# Altium footprint library PcbLib_jp.PcbLib: 255 footprints (part 7 of 16)
Each footprint in its own frame and in the unit in brackets; x right, y up, seen from the top. Pads: shape width x height; smd on the part's side, far side on the other; paste and mask are expansions set on the pad; w line width, h text height; cw(c..) or ccw(c..) is an arc to the next point about the centre after c.
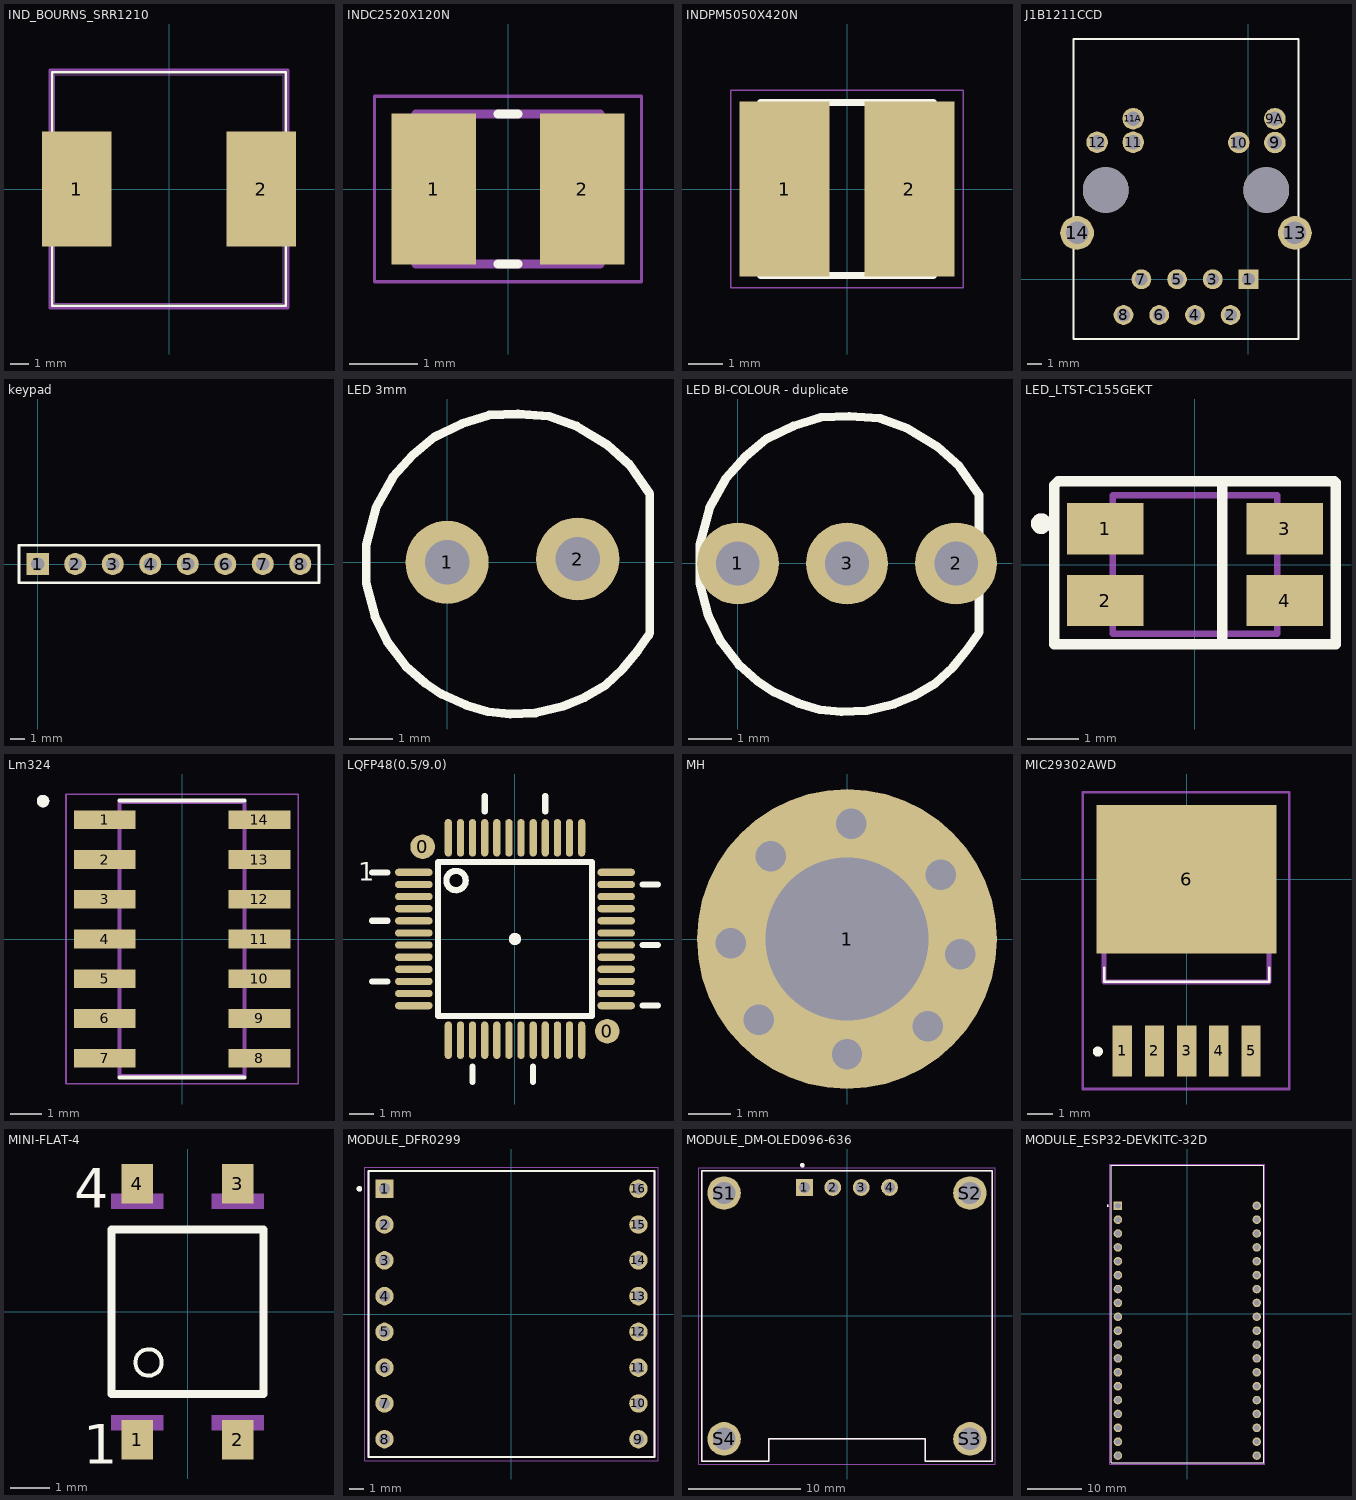
[diagram p6: the footprints below, top view; thin cyan lines are the x and y axes]

## IND_BOURNS_SRR1210 [mil]
pads (2):
  rect 149.37x248.39 smd paste+0 mask+0: 1(-198.5,0) 2(198.5,0)
Top Overlay:
  lines w6: -251,-117.6 -251,-251 251,-251 251,-117.6 ; -251,117.6 -251,251 251,251 251,117.6
Mechanical 13:
  lines w1: -246,-246 -246,246 246,246 246,-246 -246,-246
Mechanical 15:
  lines w6: -263.5,-114.5 -256,-114.5 -256,-256 256,-256 256,-114.5 263.5,-114.5 263.5,114.5 256,114.5 256,256 -256,256 -256,114.5 -263.5,114.5 -263.5,-114.5
3D body "IND_BOURNS_SRR1210.step": height 394.02, standoff 0, extent -248.74,-241.38 243.23,250.83

## INDC2520X120N [mm]
pads (2):
  rect 1.24x2.22 smd: 1(-1.09,0) 2(1.09,0)
Top Overlay:
  lines w0.127: -0.15,-1.1 0.15,-1.1 ; -0.15,1.1 0.15,1.1
Mechanical 13:
  lines w0.127: -1.35,-1.1 -1.35,1.1 1.35,1.1 1.35,-1.1 -1.35,-1.1
Mechanical 15:
  lines w0.05: -1.958,-1.358 -1.958,1.358 1.958,1.358 1.958,-1.358 -1.958,-1.358
3D body "DFE252012F-100M_P2.step": height 1.2, standoff 0, extent -1.17,-1.04 1.33,0.96

## INDPM5050X420N [mm]
pads (2):
  rect 2.6x5.05 smd: 1(-1.8,0) 2(1.8,0)
Top Overlay:
  lines w0.2: -2.5,-2.5 2.5,-2.5 ; -2.5,2.5 2.5,2.5
Mechanical 13:
  lines w0.1: -2.5,-2.5 2.5,-2.5 2.5,2.5 -2.5,2.5 -2.5,-2.5
Mechanical 15:
  lines w0.05: -3.35,-2.85 3.35,-2.85 3.35,2.85 -3.35,2.85 -3.35,-2.85
3D body "TYS5040150M-10.stp": height 4.2, standoff 0, extent -2.5,-2.5 2.5,2.5

## J1B1211CCD [mm]
pads (18):
  rect 1.408x1.408 hole 0.9: 1(0,0)
  round 1.408 hole 0.9: 2(-1.27,-2.54) 3(-2.54,0) 4(-3.81,-2.54) 5(-5.08,0) 6(-6.35,-2.54) 7(-7.62,0) 8(-8.89,-2.54)
  round 1.53 hole 1.02: 9(1.88,9.73) 9A(1.88,11.43) 10(-0.687,9.73) 11(-8.203,9.754) 11A(-8.203,11.43) 12(-10.77,9.754)
  round 2.4 hole 1.6: 13(3.305,3.3) 14(-12.195,3.3)
  round 3.25 hole 3.25 unplated: ""(-10.16,6.35) ""(1.27,6.35)
Top Overlay:
  lines w0.127: -12.445,-4.25 3.555,-4.25 3.555,17.1 -12.445,17.1 -12.445,-4.25
3D body: height 9.01, standoff -9.01, extent -0.356,0.127 -0.356,0.127
3D body "User Library-J1B1211CCD.STEP": height 14.46, standoff -3.85, extent -13.632,-4.173 4.387,17.127

## keypad [mm] "Connector; Header; 8 Position"
pads (8):
  rect 1.5x1.5 hole 0.9: 1(0,0)
  round 1.5 hole 0.9: 2(2.54,0) 3(5.08,0) 4(7.62,0) 5(10.16,0) 6(12.7,0) 7(15.24,0) 8(17.78,0)
Top Overlay:
  lines w0.2: -1.27,-1.27 -1.27,1.27 19.05,1.27 19.05,-1.27 -1.27,-1.27
3D body "User Library-GrayhillKeypad.STEP": height 9.29, standoff -7.11, extent -20.04,-1 35.84,75.2

## LED 3mm [mil]
pads (2):
  round 75 / inner round 60 / far side round 75 hole 40: 1(0,0) 2(118,3)
Top Overlay:
  lines w8: 182,-66 172,-80 159,-96 143,-111 124,-122 105,-130 80,-136 57,-137 37,-135 17,-129 -5,-119 -20,-109 -37,-94 -54,-72 -65,-49 -73,-19 -73,16 -64,50 -49,77 -31,97 -12,113 13,125 38,133 64,134 92,132 117,123 145,106 165,88 183,62 183,-64
3D body "CircuitWorks-LED DIP 3MM.STEP": height 295.28, standoff -39.37, extent -17.72,-70.87 120.08,78.74
3D body: height 39.47, standoff -55.12, extent 47,-32 47,-32

## LED BI-COLOUR - duplicate [mil]
pads (3):
  round 75 / inner round 60 / far side round 75 hole 40: 1(0,0) 2(200,0) 3(100,0)
Top Overlay:
  lines w8: 220,-65 210,-79 197,-95 181,-110 162,-121 143,-129 118,-135 95,-136 75,-134 55,-128 33,-118 18,-108 1,-93 -16,-71 -27,-48 -35,-18 -35,17 -26,51 -11,78 7,98 26,114 51,126 76,134 102,135 130,133 155,124 183,107 203,89 221,63 221,-63
3D body "everlight-3MM-LED-RG.STEP": height 118.11, standoff -262.79, extent -7.87,-74.8 207.88,74.81

## LED_LTST-C155GEKT [mm]
pads (4):
  rect 1.5x1 smd: 1(-1.75,0.7) 2(-1.75,-0.7) 3(1.75,0.7) 4(1.75,-0.7)
Top Overlay:
  circle w0.2: c-3,0.8 r0.1
  lines w0.203: -2.718,1.575 -2.743,1.549 -2.743,-1.549 2.743,-1.549 2.743,1.6 ; -2.692,1.6 -2.667,1.626 2.718,1.626 ; 0.533,-1.448 0.533,1.626
Mechanical 13:
  circle w0.2: c-3,0.8 r0.1
  lines w0.127: -1.6,-1.35 1.6,-1.35 1.6,1.35 -1.6,1.35 -1.6,-1.35
Mechanical 15:
  lines w0.05: -2.75,-1.6 2.75,-1.6 2.75,1.6 -2.75,1.6 -2.75,-1.6
3D body "LTST-C155KGJRKT.STEP": height 1.1, standoff 0, extent -1.6,-1.35 1.6,1.35

## Lm324 [mm]
pads (14):
  rect 1.97x0.6 smd: 1(-2.475,3.81) 2(-2.475,2.54) 3(-2.475,1.27) 4(-2.475,0) 5(-2.475,-1.27) 6(-2.475,-2.54) 7(-2.475,-3.81) 8(2.475,-3.81) 9(2.475,-2.54) 10(2.475,-1.27) 11(2.475,0) 12(2.475,1.27) 13(2.475,2.54) 14(2.475,3.81)
Top Overlay:
  circle w0.2: c-4.445,4.41 r0.1
  lines w0.127: -2,-4.43 2,-4.43 ; -2,4.43 2,4.43
Mechanical 13:
  circle w0.2: c-4.445,4.41 r0.1
  circle w0.2: c-4.445,4.41 r0.1
  lines w0.127: -2,-4.375 -2,4.375 ; -2,-4.375 2,-4.375 ; -2,-4.375 -2,4.375 ; -2,-4.375 2,-4.375 ; -2,4.375 2,4.375 ; -2,4.375 2,4.375 ; 2,-4.375 2,4.375 ; 2,-4.375 2,4.375
Mechanical 16:
  lines w0.05: -3.71,-4.625 -3.71,4.625 3.71,4.625 3.71,-4.625 -3.71,-4.625
3D body "User Library-so14p865x390ll600ls127h155.STEP": height 1.55, standoff 0, extent -3,-4.35 3,4.3

## LQFP48(0.5/9.0) [mm]
height 3.9
pads (50):
  round 1.016 smd: 0(-3.81,3.81) 0(3.81,-3.81)
  oval 1.55x0.3 smd: 1(-4.175,2.75) 2(-4.175,2.25) 3(-4.175,1.75) 4(-4.175,1.25) 5(-4.175,0.75) 6(-4.175,0.25) 7(-4.175,-0.25) 8(-4.175,-0.75) 9(-4.175,-1.25) 10(-4.175,-1.75) 11(-4.175,-2.25) 12(-4.175,-2.75) 25(4.175,-2.75) 26(4.175,-2.25) 27(4.175,-1.75) 28(4.175,-1.25) 29(4.175,-0.75) 30(4.175,-0.25) 31(4.175,0.25) 32(4.175,0.75) 33(4.175,1.25) 34(4.175,1.75) 35(4.175,2.25) 36(4.175,2.75)
  oval 0.3x1.55 smd: 13(-2.75,-4.175) 14(-2.25,-4.175) 15(-1.75,-4.175) 16(-1.25,-4.175) 17(-0.75,-4.175) 18(-0.25,-4.175) 19(0.25,-4.175) 20(0.75,-4.175) 21(1.25,-4.175) 22(1.75,-4.175) 23(2.25,-4.175) 24(2.75,-4.175) 37(2.75,4.175) 38(2.25,4.175) 39(1.75,4.175) 40(1.25,4.175) 41(0.75,4.175) 42(0.25,4.175) 43(-0.25,4.175) 44(-0.75,4.175) 45(-1.25,4.175) 46(-1.75,4.175) 47(-2.25,4.175) 48(-2.75,4.175)
Top Overlay:
  circle w0.254: c-2.432,2.413 r0.4
  circle w0.254: c0,0 r0.127
  lines w0.254: -5.901,-1.75 -5.266,-1.75 ; -5.901,0.75 -5.266,0.75 ; -5.901,2.75 -5.266,2.75 ; -1.75,-5.901 -1.75,-5.266 ; -1.25,5.266 -1.25,5.901 ; 0.75,-5.901 0.75,-5.266 ; 1.25,5.266 1.25,5.901 ; 5.266,-2.75 5.901,-2.75 ; 5.266,-0.25 5.901,-0.25 ; 5.266,2.25 5.901,2.25 ; -3.175,-3.175 3.175,-3.175 3.175,3.175 -3.175,3.175 -3.175,-3.175
  text "1" at -6.477,2.413 h0.76
3D body "User Library-lqfp48-1.STEP": height 1.5, standoff 0.02, extent -4.5,-4.5 4.5,4.5

## MH [mm]
pads (1):
  round 7 hole 3.8: 1(0,0)
via -1.778,1.93 diameter 1.27 hole 0.711
via -2.718,-0.102 diameter 1.27 hole 0.711
via -2.057,-1.88 diameter 1.27 hole 0.711
via 0,-2.692 diameter 1.27 hole 0.711
via 1.88,-2.032 diameter 1.27 hole 0.711
via 2.642,-0.356 diameter 1.27 hole 0.711
via 2.184,1.499 diameter 1.27 hole 0.711
via 0.102,2.692 diameter 1.27 hole 0.711
Top Overlay:
  circle w0.127: c0,0 r1.27
Mechanical 13:
  circle w0.127: c0,0 r1.27
  circle w0.127: c0,0 r1.27
Mechanical 16:
  circle w0.05: c0,0 r1.52

## MIC29302AWD [mm]
pads (6):
  rect 0.76x2 smd: 1(-2.54,-6.775) 2(-1.27,-6.775) 3(0,-6.775) 4(1.27,-6.775) 5(2.54,-6.775)
  rect 7.1x5.85 smd: 6(0,0)
Top Overlay:
  lines w0.1: -3.251,-3.5 -3.251,-4.05 3.251,-4.05 3.251,-3.5
  lines w0.2: -3.5,-6.9 cw(c-3.5,-6.8) -3.5,-6.7 cw(c-3.5,-6.8) -3.5,-6.9
Mechanical 13:
  lines w0.2: -3.251,-4.05 3.251,-4.05 3.251,2.05 -3.251,2.05 -3.251,-4.05
Mechanical 15:
  lines w0.1: -4.1,-8.275 4.05,-8.275 4.05,3.425 -4.1,3.425 -4.1,-8.275
3D body "User Library-DPAK-5-1.STEP": height 2.4, standoff -0.01, extent -3.31,-7.436 3.39,3.43

## MINI-FLAT-4 [mm]
pads (4):
  rect 0.8x1 smd: 1(-1.27,-3.25) 2(1.27,-3.25) 3(1.27,3.25) 4(-1.27,3.25)
Top Overlay:
  circle w0.102: c-0.989,-1.285 r0.335
  lines w0.203: -1.925,-2.085 1.925,-2.085 1.925,2.085 -1.925,2.085 -1.925,-2.085
  text "4" at -2.87,2.642 h1
  text "1" at -2.642,-3.861 h1
Mechanical 13:
  region: -1.93,3.001 -0.61,3.001 -0.61,2.62 -1.93,2.62
  region: 0.61,3.001 1.93,3.001 1.93,2.62 0.61,2.62
  region: 0.61,-2.62 1.93,-2.62 1.93,-3.001 0.61,-3.001
  region: -1.93,-2.62 -0.61,-2.62 -0.61,-3.001 -1.93,-3.001
  region: -1.93,3.001 -0.61,3.001 -0.61,2.62 -1.93,2.62
  region: 0.61,3.001 1.93,3.001 1.93,2.62 0.61,2.62
  region: 0.61,-2.62 1.93,-2.62 1.93,-3.001 0.61,-3.001
  region: -1.93,-2.62 -0.61,-2.62 -0.61,-3.001 -1.93,-3.001
3D body "User Library-LTV-356T.STEP": height 3, standoff 0.9, extent -1.925,-3.474 1.925,3.526

## MODULE_DFR0299 [mm]
pads (16):
  rect 1.308x1.308 hole 0.8: 1(-9.017,8.89)
  round 1.308 hole 0.8: 2(-9.017,6.35) 3(-9.017,3.81) 4(-9.017,1.27) 5(-9.017,-1.27) 6(-9.017,-3.81) 7(-9.017,-6.35) 8(-9.017,-8.89) 9(9.017,-8.89) 10(9.017,-6.35) 11(9.017,-3.81) 12(9.017,-1.27) 13(9.017,1.27) 14(9.017,3.81) 15(9.017,6.35) 16(9.017,8.89)
Top Overlay:
  circle w0.2: c-10.8,8.89 r0.1
  lines w0.127: -10.16,-10.16 10.16,-10.16 10.16,10.16 -10.16,10.16 -10.16,-10.16
Mechanical 13:
  circle w0.2: c-10.8,8.89 r0.1
  lines w0.127: -10.16,-10.16 -10.16,10.16 10.16,10.16 10.16,-10.16 -10.16,-10.16
Mechanical 15:
  lines w0.05: -10.41,-10.41 -10.41,10.41 10.41,10.41 10.41,-10.41 -10.41,-10.41
3D body "User Library-MP3-TF-16P.STEP": height 10.47, standoff -1.07, extent -10.925,-11.142 10.585,10.8

## MODULE_DM-OLED096-636 [mm]
height 11.3
pads (8):
  rect 1.508x1.508 / inner round 1.508 / far side rect 1.508x1.508 hole 1: 1(-3.81,11.5)
  round 1.508 hole 1: 2(-1.27,11.5) 3(1.27,11.5) 4(3.81,11.5)
  round 3 hole 2: S1(-11,11) S2(11,11) S3(11,-11) S4(-11,-11)
Top Overlay:
  circle w0.2: c-4,13.5 r0.1
  lines w0.127: -13,-13 -13,13 13,13 13,-13 7,-13 7,-11 -7,-11 -7,-13 -13,-13
Mechanical 13:
  circle w0.2: c-4,13.5 r0.1
  lines w0.127: -13,-13 -13,13 13,13 13,-13 7,-13 7,-11 -7,-11 -7,-13 -13,-13
Mechanical 15:
  lines w0.05: -13.25,-13.25 -13.25,13.25 13.25,13.25 13.25,-13.25 -13.25,-13.25
3D body "step_temp.STEP": height 5.66, standoff -5.64, extent -13,-13 13,13

## MODULE_ESP32-DEVKITC-32D [mm]
pads (38):
  rect 1.56x1.56 / inner round 1.56 / far side rect 1.56x1.56 hole 1.04: J2-1(-12.7,19.76)
  round 1.56 hole 1.04: J2-2(-12.7,17.22) J2-3(-12.7,14.68) J2-4(-12.7,12.14) J2-5(-12.7,9.6) J2-6(-12.7,7.06) J2-7(-12.7,4.52) J2-8(-12.7,1.98) J2-9(-12.7,-0.56) J2-10(-12.7,-3.1) J2-11(-12.7,-5.64) J2-12(-12.7,-8.18) J2-13(-12.7,-10.72) J2-14(-12.7,-13.26) J2-15(-12.7,-15.8) J2-16(-12.7,-18.34) J2-17(-12.7,-20.88) J2-18(-12.7,-23.42) J2-19(-12.7,-25.96) J3-1(12.7,19.76) J3-2(12.7,17.22) J3-3(12.7,14.68) J3-4(12.7,12.14) J3-5(12.7,9.6) J3-6(12.7,7.06) J3-7(12.7,4.52) J3-8(12.7,1.98) J3-9(12.7,-0.56) J3-10(12.7,-3.1) J3-11(12.7,-5.64) J3-12(12.7,-8.18) J3-13(12.7,-10.72) J3-14(12.7,-13.26) J3-15(12.7,-15.8) J3-16(12.7,-18.34) J3-17(12.7,-20.88) J3-18(12.7,-23.42) J3-19(12.7,-25.96)
Top Overlay:
  circle w0.2: c-14.6,19.76 r0.1
  lines w0.127: -13.95,-27.25 13.95,-27.25 13.95,27.15 -13.95,27.15 -13.95,-27.25
Mechanical 13:
  circle w0.2: c-14.6,19.76 r0.1
  lines w0.127: -13.95,-27.25 -13.95,27.15 13.95,27.15 13.95,-27.25 -13.95,-27.25
Mechanical 15:
  lines w0.05: -14.2,-27.5 -14.2,27.4 14.2,27.4 14.2,-27.5 -14.2,-27.5
3D body "step_temp.STEP": height 3.25, standoff -9.44, extent -13.97,-24.8 13.97,30.3